# Altium footprint library Semiconductor.PcbLib: 73 footprints (part 2 of 5)
Each footprint in its own frame and in the unit in brackets; x right, y up, seen from the top. Pads: shape width x height; smd on the part's side, far side on the other; paste and mask are expansions set on the pad; w line width, h text height; cw(c..) or ccw(c..) is an arc to the next point about the centre after c.
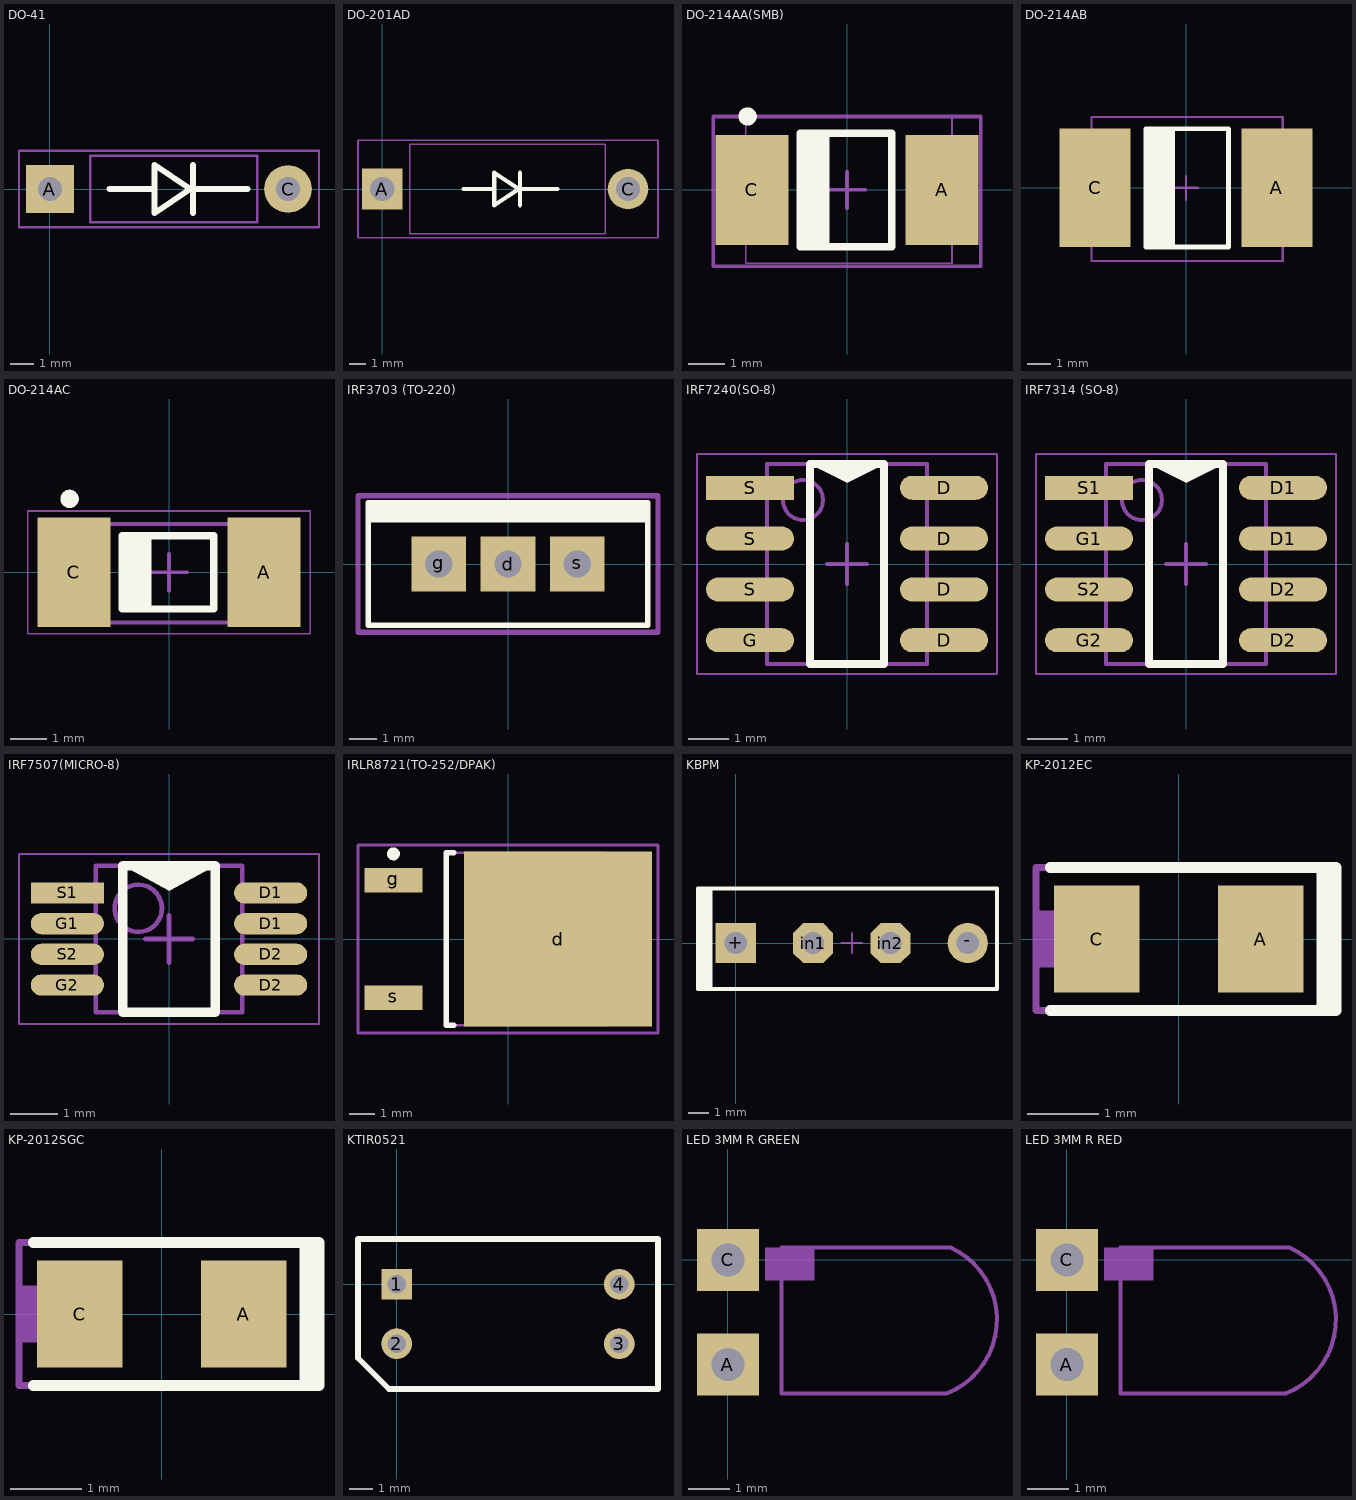
[diagram p1: the footprints below, top view; thin cyan lines are the x and y axes]

## DO-41 [mm]
pads (2):
  rect 2x2 hole 1: A(0,0)
  round 2 hole 1: C(10,0)
Top Overlay:
  lines w0.254: 2.5,0 4.4,0 ; 6,-1 6,1 ; 6,0 8.3,0 ; 4.4,-1 4.4,1 5.9,0 4.4,-1
Mechanical 13:
  lines w0.1: 1.7,-1.4 8.7,-1.4 8.7,1.4 1.7,1.4 1.7,-1.4
Mechanical 15:
  lines w0.1: -1.3,-1.6 -1.3,1.6 11.3,1.6 11.3,-1.6 -1.3,-1.6
3D body: height 4.36, standoff -1, extent -0.46,-1.355 10.4,1.37

## DO-201AD [mm]
pads (2):
  rect 2.5x2.5 hole 1.5: A(0,0)
  round 2.5 hole 1.5: C(15.15,0)
Top Overlay:
  lines w0.254: 5,0 6.9,0 ; 8.5,-1 8.5,1 ; 8.5,0 10.8,0 ; 6.9,-1 6.9,1 8.4,0 6.9,-1
Mechanical 13:
  lines w0.1: 1.7,-2.75 13.75,-2.75 13.75,2.75 1.7,2.75 1.7,-2.75
Mechanical 15:
  lines w0.1: -1.5,-3 -1.5,3 17,3 17,-3 -1.5,-3
3D body: height 7.6, standoff -4, extent -0.711,-2.769 15.849,2.831

## DO-214AA(SMB) [mm]
pads (2):
  rect 2x3 smd: A(2.598,0) C(-2.598,0)
Top Overlay:
  circle w0.25: c-2.716,2.007 r0.125
  rectangle: -1.275,-1.549 -0.475,1.549
  lines w0.2: -1.275,-1.549 -1.275,1.549 1.225,1.549 1.225,-1.549 -1.275,-1.549
Mechanical 13:
  lines w0.1: -3.658,-2.083 3.658,-2.083 3.658,2.007 -3.658,2.007 -3.658,-2.083
Mechanical 15:
  lines w0.05: -2.769,-2.007 -2.769,2.007 2.87,2.007 2.87,-2.007 -2.769,-2.007
  lines w0.1: -0.5,0 0.5,0 ; 0,-0.5 0,0.5
3D body: height 2.6, standoff -0.05, extent -2.768,-2 2.82,1.95

## DO-214AB [mm]
pads (2):
  rect 3x5 smd: A(3.848,0) C(-3.848,0)
Top Overlay:
  rectangle: -1.7,-2.5 -0.475,2.5
  lines w0.2: -1.7,-2.5 1.8,-2.5 1.8,2.5 -1.7,2.5 -1.7,-2.5
Mechanical 13:
  lines w0.1: -4,-3.1 -4,3 4.1,3 4.1,-3.1 -4,-3.1
Mechanical 15:
  lines w0.05: -4,-3.1 4.1,-3.1 4.1,3 -4,3 -4,-3.1
  lines w0.1: -0.5,0 0.5,0 ; 0,-0.5 0,0.5
3D body: height 2.4, standoff 0.03, extent -4.039,-3.075 4.091,3.025

## DO-214AC [mm]
pads (2):
  rect 2x3 smd: A(2.598,0) C(-2.598,0)
Top Overlay:
  circle w0.25: c-2.716,2.007 r0.125
  rectangle: -1.275,-1 -0.475,1
  lines w0.2: -1.275,-1 1.225,-1 1.225,1 -1.275,1 -1.275,-1
Mechanical 13:
  lines w0.1: -2.616,-1.372 -2.616,1.321 2.591,1.321 2.591,-1.372 -2.616,-1.372
Mechanical 15:
  lines w0.05: -3.861,-1.676 3.861,-1.676 3.861,1.676 -3.861,1.676 -3.861,-1.676
  lines w0.1: -0.5,0 0.5,0 ; 0,-0.5 0,0.5
3D body: height 2.6, standoff 0.03, extent -2.724,-1.425 2.776,1.375

## IRF3703 (TO-220) [mm] "Два выпрямительных скоростных диода в корпусе TO-220"
pads (3):
  rect 2x2 hole 1: d(0,0) g(-2.54,0) s(2.54,0)
Top Overlay:
  lines w0.2: -5.125,1.625 5.125,1.625 ; -5.125,1.75 5,1.75 5.125,1.875 -5,1.875 -5,2.125 5.125,2.125 ; -5.125,2 5.125,2 ; -5.125,-2.25 -5.125,2.25 5.125,2.25 5.125,-2.25 -5.125,-2.25
Mechanical 15:
  lines w0.2: -5.5,-2.5 -5.5,2.5 5.5,2.5 5.5,-2.5 -5.5,-2.5
3D body: height 18.8, standoff -2.88, extent -4.826,-2.25 4.826,2.25

## IRF7240(SO-8) [mm]
pads (8):
  oval 2.2x0.6 smd: D(2.425,-1.905) D(2.425,-0.635) D(2.425,0.635) D(2.425,1.905) G(-2.425,-1.905) S(-2.425,-0.635) S(-2.425,0.635)
  rect 2.2x0.6 smd: S(-2.425,1.905)
Top Overlay:
  region: -0.925,2.5 0.925,2.5 0,2.032
  lines w0.2: -0.925,-2.5 -0.925,2.5 0.925,2.5 0.925,-2.5 -0.925,-2.5
Mechanical 13:
  circle w0.1: c-1.1,1.6 r0.5
  lines w0.1: -2,-2.5 -2,2.5 2,2.5 2,-2.5 -2,-2.5
Mechanical 15:
  lines w0.05: -3.75,-2.75 -3.75,2.75 3.75,2.75 3.75,-2.75 -3.75,-2.75
  lines w0.1: -0.5,0 0.5,0 ; 0,-0.5 0,0.5
3D body: height 1.6, standoff 0, extent -3,-2.5 3.042,2.52

## IRF7314 (SO-8) [mm] "SOP, 8-Leads, Body 4,90x3,90mm, Pitch 1,27mm, IPC Medium Density"
height 1.75
pads (8):
  oval 2.2x0.6 smd: D1(2.425,0.635) D1(2.425,1.905) D2(2.425,-1.905) D2(2.425,-0.635) G1(-2.425,0.635) G2(-2.425,-1.905) S2(-2.425,-0.635)
  rect 2.2x0.6 smd: S1(-2.425,1.905)
Top Overlay:
  region: -0.925,2.5 0.925,2.5 0,2.032
  lines w0.2: -0.925,-2.5 0.925,-2.5 0.925,2.5 -0.925,2.5 -0.925,-2.5
Mechanical 13:
  circle w0.1: c-1.1,1.6 r0.5
  lines w0.1: -2,-2.5 2,-2.5 2,2.5 -2,2.5 -2,-2.5
Mechanical 15:
  lines w0.05: -3.75,-2.75 3.75,-2.75 3.75,2.75 -3.75,2.75 -3.75,-2.75
  lines w0.1: -0.5,0 0.5,0 ; 0,-0.5 0,0.5
3D body: height 1.6, standoff 0, extent -3,-2.5 3.042,2.52

## IRF7507(MICRO-8) [mm] "TSOP, 8-Leads, Body 3,00x3,00mm, Pitch 0,65mm, IPC Medium Density"
height 1.11
pads (8):
  oval 1.55x0.45 smd: D1(2.15,0.325) D1(2.15,0.975) D2(2.15,-0.975) D2(2.15,-0.325) G1(-2.15,0.325) G2(-2.15,-0.975) S2(-2.15,-0.325)
  rect 1.55x0.45 smd: S1(-2.15,0.975)
Top Overlay:
  region: -0.965,1.55 0.975,1.55 0,1.016
  lines w0.2: -0.975,-1.55 -0.975,1.55 0.975,1.55 0.975,-1.55 -0.975,-1.55
Mechanical 13:
  circle w0.1: c-0.65,0.65 r0.5
  lines w0.1: -1.55,-1.55 -1.55,1.55 1.55,1.55 1.55,-1.55 -1.55,-1.55
Mechanical 15:
  lines w0.05: -3.175,-1.8 -3.175,1.8 3.175,1.8 3.175,-1.8 -3.175,-1.8
  lines w0.1: -0.5,0 0.5,0 ; 0,-0.5 0,0.5
3D body: height 0.92, standoff 0, extent -2.5,-1.5 2.5,1.5

## IRLR8721(TO-252/DPAK) [mm] "D-PAK, 3-Pads, Body 6,2x6,7mm (max), IPC Medium Density"
height 2.39
pads (3):
  rect 7.3x6.8 smd: d(1.95,0)
  rect 2.25x0.95 smd: g(-4.45,2.28) s(-4.45,-2.28)
Top Overlay:
  circle w0.25: c-4.45,3.305 r0.125
  lines w0.2: -2.1,-3.35 -2.4,-3.35 -2.4,3.35 -2.1,3.35
Mechanical 13:
  lines w0.1: -2.4,-3.35 3.8,-3.35 3.8,3.35 -2.4,3.35 -2.4,-3.35
Mechanical 15:
  lines w0.1: -0.5,0 0.5,0 ; 0,-0.5 0,0.5 ; -5.825,-3.65 5.825,-3.65 5.825,3.65 -5.825,3.65 -5.825,-3.65
3D body: height 2.34, standoff -0.07, extent -5.094,-3.25 4.844,3.29

## KBPM [mm]
pads (4):
  rect 2x2 hole 1.1: +(0,0)
  round 2 hole 1.1: -(11.55,0)
  oct 2x2 hole 1.1: in1(3.85,0) in2(7.7,0)
Top Overlay:
  rectangle: -1.93,-2.311 -1.168,2.718
  lines w0.2: -1.88,-2.292 13.005,-2.292 13.005,2.718 -1.88,2.718 -1.88,-2.292
Mechanical 15:
  lines w0.1: 5.275,0 6.275,0 ; 5.775,-0.5 5.775,0.5 ; -1.549,-2.292 13.005,-2.292 13.005,2.718 -1.549,2.718 -1.549,-2.292
3D body: height 12.5, standoff -11.7, extent -1.549,-2.292 13.03,2.718

## KP-2012EC [mm] "RED LED 0805"
height 0.5
pads (2):
  rect 1.2x1.5 smd: A(1.148,0) C(-1.148,0)
Top Overlay:
  lines w0.15: -1.8,-1 2.2,-1 2.2,1 -1.8,1 ; 2,-1 2,1 ; 2.1,-1 2.1,1
Mechanical 29:
  rectangle: -2,-0.4 -0.8,0.4
  lines w0.1: -2,-1 -2,1 2,1 2,-1 -2,-1
  text ".Designator" at -1.6,-0.2 h1
3D body: height 1.1, standoff 0, extent -1.036,-0.62 0.966,0.63

## KP-2012SGC [mm] "GREEN LED 0805"
height 0.5
pads (2):
  rect 1.2x1.5 smd: A(1.148,0) C(-1.148,0)
Top Overlay:
  lines w0.15: -1.8,-1 2.2,-1 2.2,1 -1.8,1 ; 2,-1 2,1 ; 2.1,-1 2.1,1
Mechanical 29:
  rectangle: -2,-0.4 -0.8,0.4
  lines w0.1: -2,-1 -2,1 2,1 2,-1 -2,-1
  text ".Designator" at -1.6,-0.2 h1
3D body: height 1.1, standoff 0, extent -1.036,-0.62 0.966,0.63

## KTIR0521 [mm]
height 7
pads (4):
  rect 1.3x1.3 hole 0.8: 1(0,0)
  round 1.3 hole 0.8: 2(0,-2.54) 3(9.5,-2.54) 4(9.5,0)
Top Overlay:
  lines w0.25: -1.649,-3.151 -1.649,1.93 11.151,1.93 11.151,-4.47 -0.331,-4.47 -1.649,-3.151
Mechanical 15:
  circle w0.3: c9.5,0 r0.5
  circle w0.3: c9.5,-2.54 r0.5
  circle w0.3: c0,-2.54 r0.5
  circle w0.3: c0,0 r0.5
3D body: height 7.1, standoff -4.4, extent -1.649,-4.47 11.151,1.93

## LED 3MM R GREEN [mm] "RED LED 2.54 R"
height 0.5
pads (2):
  rect 1.5x1.5 hole 0.8: A(0,-2.54) C(0,0)
Mechanical 29:
  rectangle: 0.9,-0.5 2.1,0.3
  lines w0.1: 1.3,-3.242 5.3,-3.242 ccw(c4.601,-1.45) 5.4,0.3 1.3,0.3 1.3,0.3 1.3,-3.242
  text ".Designator" at 1.9,-1.7 h1
3D body: height 3.99, standoff -2, extent -0.152,-3.183 6.6,0.35

## LED 3MM R RED [mm] "RED LED 2.54 R"
height 0.5
pads (2):
  rect 1.5x1.5 hole 0.8: A(0,-2.54) C(0,0)
Mechanical 29:
  rectangle: 0.9,-0.5 2.1,0.3
  lines w0.1: 1.3,-3.242 5.3,-3.242 ccw(c4.601,-1.45) 5.4,0.3 1.3,0.3 1.3,0.3 1.3,-3.242
  text ".Designator" at 1.9,-1.7 h1
3D body: height 4, standoff -2, extent -0.228,-3.271 6.524,0.279